# Altium integrated library Altium_WCAP-ATG8 (rev22a).IntLib: 195 symbols (part 1 of 2)
Pins are listed as number, name and electrical type; pins without a type are passive.

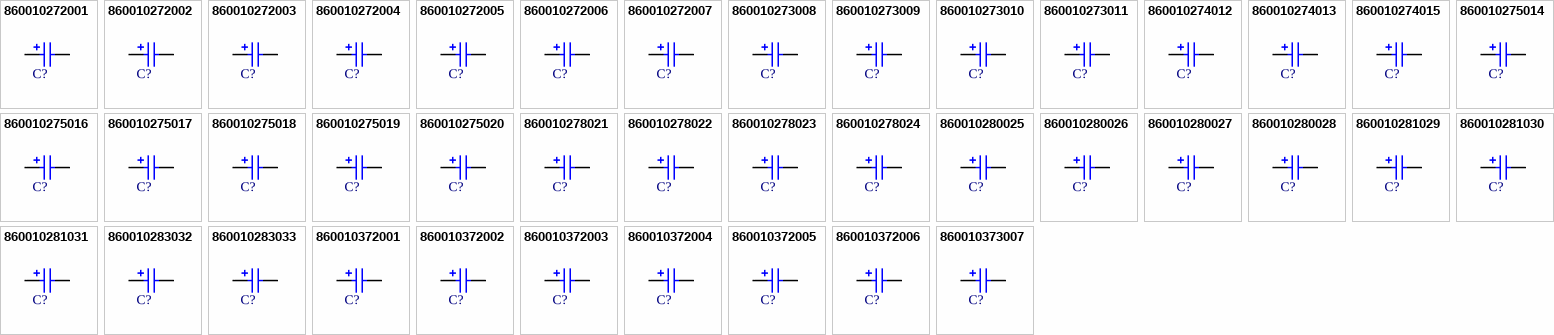
[diagram p0: symbols 860010272001 to 860010373007]

## 860010272001
designator C?, comment 22uF  (value not drawn)
WCAP-ATG8 Aluminum Electrolytic Capacitor, Radial THT, D5xH11mm, 22uF, 10V; Manufacturer: Wurth Elektronik; Manufacturer Part Number: 860010272001; Capacitance Tolerance: +/-20%; Dissipation Factor: 19%; Endurance: 2000h; Leakage Current: 3uA; Ripple Current: 66mA; Technical Reference: ATBC110220M010DSPA3B000; ComponentLink1Description: Manufacturer Link; ComponentLink1URL: https://www.we-online.com/redexpert/article/860010272001?ad; ComponentLink2Description: Datasheet; ComponentLink2URL: https://www.we-online.com/redexpert/spec/860010272001?ad; Category: Aluminum Electrolytic Capacitors; Match Code: WCAP-ATG8; Mount: Through Hole; Operating Temperature Max: 85°C; Operating Temperature Min: -40°C; Packaging: Ammo Pack; Height: 11mm; Diameter: 5mm; Capacitance: 22uF; Rated Voltage (DC): 10V
footprint WCAP-ATG8_D5H11
pins: 1 P, 2 N

## 860010272002
designator C?, comment 33uF  (value not drawn)
WCAP-ATG8 Aluminum Electrolytic Capacitor, Radial THT, D5xH11mm, 33uF, 10V; Manufacturer: Wurth Elektronik; Manufacturer Part Number: 860010272002; Capacitance Tolerance: +/-20%; Dissipation Factor: 19%; Endurance: 2000h; Leakage Current: 3.3uA; Ripple Current: 88mA; Technical Reference: ATBC110330M010DSPA3B000; ComponentLink1Description: Manufacturer Link; ComponentLink1URL: https://www.we-online.com/redexpert/article/860010272002?ad; ComponentLink2Description: Datasheet; ComponentLink2URL: https://www.we-online.com/redexpert/spec/860010272002?ad; Category: Aluminum Electrolytic Capacitors; Match Code: WCAP-ATG8; Mount: Through Hole; Operating Temperature Max: 85°C; Operating Temperature Min: -40°C; Packaging: Ammo Pack; Height: 11mm; Diameter: 5mm; Capacitance: 33uF; Rated Voltage (DC): 10V
footprint WCAP-ATG8_D5H11
pins: 1 P, 2 N

## 860010272003
designator C?, comment 47uF  (value not drawn)
WCAP-ATG8 Aluminum Electrolytic Capacitor, Radial THT, D5xH11mm, 47uF, 10V; Manufacturer: Wurth Elektronik; Manufacturer Part Number: 860010272003; Capacitance Tolerance: +/-20%; Dissipation Factor: 19%; Endurance: 2000h; Leakage Current: 4.7uA; Ripple Current: 105mA; Technical Reference: ATBC110470M010DSPA3B000; ComponentLink1Description: Manufacturer Link; ComponentLink1URL: https://www.we-online.com/redexpert/article/860010272003?ad; ComponentLink2Description: Datasheet; ComponentLink2URL: https://www.we-online.com/redexpert/spec/860010272003?ad; Category: Aluminum Electrolytic Capacitors; Match Code: WCAP-ATG8; Mount: Through Hole; Operating Temperature Max: 85°C; Operating Temperature Min: -40°C; Packaging: Ammo Pack; Height: 11mm; Diameter: 5mm; Capacitance: 47uF; Rated Voltage (DC): 10V
footprint WCAP-ATG8_D5H11
pins: 1 P, 2 N

## 860010272004
designator C?, comment 68uF  (value not drawn)
WCAP-ATG8 Aluminum Electrolytic Capacitor, Radial THT, D5xH11mm, 68uF, 10V; Manufacturer: Wurth Elektronik; Manufacturer Part Number: 860010272004; Capacitance Tolerance: +/-20%; Dissipation Factor: 19%; Endurance: 2000h; Leakage Current: 6.8uA; Ripple Current: 132mA; Technical Reference: ATBC110680M010DSPA3B000; ComponentLink1Description: Manufacturer Link; ComponentLink1URL: https://www.we-online.com/redexpert/article/860010272004?ad; ComponentLink2Description: Datasheet; ComponentLink2URL: https://www.we-online.com/redexpert/spec/860010272004?ad; Category: Aluminum Electrolytic Capacitors; Match Code: WCAP-ATG8; Mount: Through Hole; Operating Temperature Max: 85°C; Operating Temperature Min: -40°C; Packaging: Ammo Pack; Height: 11mm; Diameter: 5mm; Capacitance: 68uF; Rated Voltage (DC): 10V
footprint WCAP-ATG8_D5H11
pins: 1 P, 2 N

## 860010272005
designator C?, comment 100uF  (value not drawn)
WCAP-ATG8 Aluminum Electrolytic Capacitor, Radial THT, D5xH11mm, 100uF, 10V; Manufacturer: Wurth Elektronik; Manufacturer Part Number: 860010272005; Capacitance Tolerance: +/-20%; Dissipation Factor: 19%; Endurance: 2000h; Leakage Current: 10uA; Ripple Current: 198mA; Technical Reference: ATBC110101M010DSPA3B000; ComponentLink1Description: Manufacturer Link; ComponentLink1URL: https://www.we-online.com/redexpert/article/860010272005?ad; ComponentLink2Description: Datasheet; ComponentLink2URL: https://www.we-online.com/redexpert/spec/860010272005?ad; Category: Aluminum Electrolytic Capacitors; Match Code: WCAP-ATG8; Mount: Through Hole; Operating Temperature Max: 85°C; Operating Temperature Min: -40°C; Packaging: Ammo Pack; Height: 11mm; Diameter: 5mm; Capacitance: 100uF; Rated Voltage (DC): 10V
footprint WCAP-ATG8_D5H11
pins: 1 P, 2 N

## 860010272006
designator C?, comment 120uF  (value not drawn)
WCAP-ATG8 Aluminum Electrolytic Capacitor, Radial THT, D5xH11mm, 120uF, 10V; Manufacturer: Wurth Elektronik; Manufacturer Part Number: 860010272006; Capacitance Tolerance: +/-20%; Dissipation Factor: 19%; Endurance: 2000h; Leakage Current: 12uA; Ripple Current: 209mA; Technical Reference: ATBC110121M010DSPA3B000; ComponentLink1Description: Manufacturer Link; ComponentLink1URL: https://www.we-online.com/redexpert/article/860010272006?ad; ComponentLink2Description: Datasheet; ComponentLink2URL: https://www.we-online.com/redexpert/spec/860010272006?ad; Category: Aluminum Electrolytic Capacitors; Match Code: WCAP-ATG8; Mount: Through Hole; Operating Temperature Max: 85°C; Operating Temperature Min: -40°C; Packaging: Ammo Pack; Height: 11mm; Diameter: 5mm; Capacitance: 120uF; Rated Voltage (DC): 10V
footprint WCAP-ATG8_D5H11
pins: 1 P, 2 N

## 860010272007
designator C?, comment 150uF  (value not drawn)
WCAP-ATG8 Aluminum Electrolytic Capacitor, Radial THT, D5xH11mm, 150uF, 10V; Manufacturer: Wurth Elektronik; Manufacturer Part Number: 860010272007; Capacitance Tolerance: +/-20%; Dissipation Factor: 19%; Endurance: 2000h; Leakage Current: 15uA; Ripple Current: 231mA; Technical Reference: ATBC110151M010DSPA3B000; ComponentLink1Description: Manufacturer Link; ComponentLink1URL: https://www.we-online.com/redexpert/article/860010272007?ad; ComponentLink2Description: Datasheet; ComponentLink2URL: https://www.we-online.com/redexpert/spec/860010272007?ad; Category: Aluminum Electrolytic Capacitors; Match Code: WCAP-ATG8; Mount: Through Hole; Operating Temperature Max: 85°C; Operating Temperature Min: -40°C; Packaging: Ammo Pack; Height: 11mm; Diameter: 5mm; Capacitance: 150uF; Rated Voltage (DC): 10V
footprint WCAP-ATG8_D5H11
pins: 1 P, 2 N

## 860010273008
designator C?, comment 180uF  (value not drawn)
WCAP-ATG8 Aluminum Electrolytic Capacitor, Radial THT, D6.3xH11mm, 180uF, 10V; Manufacturer: Wurth Elektronik; Manufacturer Part Number: 860010273008; Capacitance Tolerance: +/-20%; Dissipation Factor: 19%; Endurance: 2000h; Leakage Current: 18uA; Ripple Current: 253mA; Technical Reference: ATBD110181M010DSPA4B000; ComponentLink1Description: Manufacturer Link; ComponentLink1URL: https://www.we-online.com/redexpert/article/860010273008?ad; ComponentLink2Description: Datasheet; ComponentLink2URL: https://www.we-online.com/redexpert/spec/860010273008?ad; Category: Aluminum Electrolytic Capacitors; Match Code: WCAP-ATG8; Mount: Through Hole; Operating Temperature Max: 85°C; Operating Temperature Min: -40°C; Packaging: Ammo Pack; Height: 11mm; Diameter: 6.3mm; Capacitance: 180uF; Rated Voltage (DC): 10V
footprint WCAP-ATG8_D6.3H11
pins: 1 P, 2 N

## 860010273009
designator C?, comment 220uF  (value not drawn)
WCAP-ATG8 Aluminum Electrolytic Capacitor, Radial THT, D6.3xH11mm, 220uF, 10V; Manufacturer: Wurth Elektronik; Manufacturer Part Number: 860010273009; Capacitance Tolerance: +/-20%; Dissipation Factor: 19%; Endurance: 2000h; Leakage Current: 22uA; Ripple Current: 294mA; Technical Reference: ATBD110221M010DSPA4B000; ComponentLink1Description: Manufacturer Link; ComponentLink1URL: https://www.we-online.com/redexpert/article/860010273009?ad; ComponentLink2Description: Datasheet; ComponentLink2URL: https://www.we-online.com/redexpert/spec/860010273009?ad; Category: Aluminum Electrolytic Capacitors; Match Code: WCAP-ATG8; Mount: Through Hole; Operating Temperature Max: 85°C; Operating Temperature Min: -40°C; Packaging: Ammo Pack; Height: 11mm; Diameter: 6.3mm; Capacitance: 220uF; Rated Voltage (DC): 10V
footprint WCAP-ATG8_D6.3H11
pins: 1 P, 2 N

## 860010273010
designator C?, comment 330uF  (value not drawn)
WCAP-ATG8 Aluminum Electrolytic Capacitor, Radial THT, D6.3xH11mm, 330uF, 10V; Manufacturer: Wurth Elektronik; Manufacturer Part Number: 860010273010; Capacitance Tolerance: +/-20%; Dissipation Factor: 19%; Endurance: 2000h; Leakage Current: 33uA; Ripple Current: 363mA; Technical Reference: ATBD110331M010DSPA4B000; ComponentLink1Description: Manufacturer Link; ComponentLink1URL: https://www.we-online.com/redexpert/article/860010273010?ad; ComponentLink2Description: Datasheet; ComponentLink2URL: https://www.we-online.com/redexpert/spec/860010273010?ad; Category: Aluminum Electrolytic Capacitors; Match Code: WCAP-ATG8; Mount: Through Hole; Operating Temperature Max: 85°C; Operating Temperature Min: -40°C; Packaging: Ammo Pack; Height: 11mm; Diameter: 6.3mm; Capacitance: 330uF; Rated Voltage (DC): 10V
footprint WCAP-ATG8_D6.3H11
pins: 1 P, 2 N

## 860010273011
designator C?, comment 470uF  (value not drawn)
WCAP-ATG8 Aluminum Electrolytic Capacitor, Radial THT, D6.3xH11mm, 470uF, 10V; Manufacturer: Wurth Elektronik; Manufacturer Part Number: 860010273011; Capacitance Tolerance: +/-20%; Dissipation Factor: 19%; Endurance: 2000h; Leakage Current: 47uA; Ripple Current: 418mA; Technical Reference: ATBD110471M010DSPA4B000; ComponentLink1Description: Manufacturer Link; ComponentLink1URL: https://www.we-online.com/redexpert/article/860010273011?ad; ComponentLink2Description: Datasheet; ComponentLink2URL: https://www.we-online.com/redexpert/spec/860010273011?ad; Category: Aluminum Electrolytic Capacitors; Match Code: WCAP-ATG8; Mount: Through Hole; Operating Temperature Max: 85°C; Operating Temperature Min: -40°C; Packaging: Ammo Pack; Height: 11mm; Diameter: 6.3mm; Capacitance: 470uF; Rated Voltage (DC): 10V
footprint WCAP-ATG8_D6.3H11
pins: 1 P, 2 N

## 860010274012
designator C?, comment 560uF  (value not drawn)
WCAP-ATG8 Aluminum Electrolytic Capacitor, Radial THT, D8xH11.5mm, 560uF, 10V; Manufacturer: Wurth Elektronik; Manufacturer Part Number: 860010274012; Capacitance Tolerance: +/-20%; Dissipation Factor: 19%; Endurance: 2000h; Leakage Current: 56uA; Ripple Current: 506mA; Technical Reference: ATBE115561M010DSPA7B000; ComponentLink1Description: Manufacturer Link; ComponentLink1URL: https://www.we-online.com/redexpert/article/860010274012?ad; ComponentLink2Description: Datasheet; ComponentLink2URL: https://www.we-online.com/redexpert/spec/860010274012?ad; Category: Aluminum Electrolytic Capacitors; Match Code: WCAP-ATG8; Mount: Through Hole; Operating Temperature Max: 85°C; Operating Temperature Min: -40°C; Packaging: Ammo Pack; Height: 11.5mm; Diameter: 8mm; Capacitance: 560uF; Rated Voltage (DC): 10V
footprint WCAP-ATG8_D8H11.5
pins: 1 P, 2 N

## 860010274013
designator C?, comment 680uF  (value not drawn)
WCAP-ATG8 Aluminum Electrolytic Capacitor, Radial THT, D8xH11.5mm, 680uF, 10V; Manufacturer: Wurth Elektronik; Manufacturer Part Number: 860010274013; Capacitance Tolerance: +/-20%; Dissipation Factor: 19%; Endurance: 2000h; Leakage Current: 68uA; Ripple Current: 572mA; Technical Reference: ATBE115681M010DSPA7B000; ComponentLink1Description: Manufacturer Link; ComponentLink1URL: https://www.we-online.com/redexpert/article/860010274013?ad; ComponentLink2Description: Datasheet; ComponentLink2URL: https://www.we-online.com/redexpert/spec/860010274013?ad; Category: Aluminum Electrolytic Capacitors; Match Code: WCAP-ATG8; Mount: Through Hole; Operating Temperature Max: 85°C; Operating Temperature Min: -40°C; Packaging: Ammo Pack; Height: 11.5mm; Diameter: 8mm; Capacitance: 680uF; Rated Voltage (DC): 10V
footprint WCAP-ATG8_D8H11.5
pins: 1 P, 2 N

## 860010274015
designator C?, comment 1000uF  (value not drawn)
WCAP-ATG8 Aluminum Electrolytic Capacitor, Radial THT, D8xH16mm, 1000uF, 10V; Manufacturer: Wurth Elektronik; Manufacturer Part Number: 860010274015; Capacitance Tolerance: +/-20%; Dissipation Factor: 19%; Endurance: 2000h; Leakage Current: 100uA; Ripple Current: 725mA; Technical Reference: ATBE160102M010DSPA7B000; ComponentLink1Description: Manufacturer Link; ComponentLink1URL: https://www.we-online.com/redexpert/article/860010274015?ad; ComponentLink2Description: Datasheet; ComponentLink2URL: https://www.we-online.com/redexpert/spec/860010274015?ad; Category: Aluminum Electrolytic Capacitors; Match Code: WCAP-ATG8; Mount: Through Hole; Operating Temperature Max: 85°C; Operating Temperature Min: -40°C; Packaging: Ammo Pack; Height: 16mm; Diameter: 8mm; Capacitance: 1000uF; Rated Voltage (DC): 10V
footprint WCAP-ATG8_D8H16
pins: 1 P, 2 N

## 860010275014
designator C?, comment 820uF  (value not drawn)
WCAP-ATG8 Aluminum Electrolytic Capacitor, Radial THT, D10xH12.5mm, 820uF, 10V; Manufacturer: Wurth Elektronik; Manufacturer Part Number: 860010275014; Capacitance Tolerance: +/-20%; Dissipation Factor: 19%; Endurance: 2000h; Leakage Current: 82uA; Ripple Current: 671mA; Technical Reference: ATBF125821M010DSPA9B000; ComponentLink1Description: Manufacturer Link; ComponentLink1URL: https://www.we-online.com/redexpert/article/860010275014?ad; ComponentLink2Description: Datasheet; ComponentLink2URL: https://www.we-online.com/redexpert/spec/860010275014?ad; Category: Aluminum Electrolytic Capacitors; Match Code: WCAP-ATG8; Mount: Through Hole; Operating Temperature Max: 85°C; Operating Temperature Min: -40°C; Packaging: Ammo Pack; Height: 12.5mm; Diameter: 10mm; Capacitance: 820uF; Rated Voltage (DC): 10V
footprint WCAP-ATG8_D10H12.5
pins: 1 P, 2 N

## 860010275016
designator C?, comment 1000uF  (value not drawn)
WCAP-ATG8 Aluminum Electrolytic Capacitor, Radial THT, D10xH12.5mm, 1000uF, 10V; Manufacturer: Wurth Elektronik; Manufacturer Part Number: 860010275016; Capacitance Tolerance: +/-20%; Dissipation Factor: 19%; Endurance: 2000h; Leakage Current: 100uA; Ripple Current: 726mA; Technical Reference: ATBF125102M010DSPA9B000; ComponentLink1Description: Manufacturer Link; ComponentLink1URL: https://www.we-online.com/redexpert/article/860010275016?ad; ComponentLink2Description: Datasheet; ComponentLink2URL: https://www.we-online.com/redexpert/spec/860010275016?ad; Category: Aluminum Electrolytic Capacitors; Match Code: WCAP-ATG8; Mount: Through Hole; Operating Temperature Max: 85°C; Operating Temperature Min: -40°C; Packaging: Ammo Pack; Height: 12.5mm; Diameter: 10mm; Capacitance: 1000uF; Rated Voltage (DC): 10V
footprint WCAP-ATG8_D10H12.5
pins: 1 P, 2 N

## 860010275017
designator C?, comment 1200uF  (value not drawn)
WCAP-ATG8 Aluminum Electrolytic Capacitor, Radial THT, D10xH16mm, 1200uF, 10V; Manufacturer: Wurth Elektronik; Manufacturer Part Number: 860010275017; Capacitance Tolerance: +/-20%; Dissipation Factor: 19%; Endurance: 2000h; Leakage Current: 120uA; Ripple Current: 902mA; Technical Reference: ATBF160122M010DSPAAB000; ComponentLink1Description: Manufacturer Link; ComponentLink1URL: https://www.we-online.com/redexpert/article/860010275017?ad; ComponentLink2Description: Datasheet; ComponentLink2URL: https://www.we-online.com/redexpert/spec/860010275017?ad; Category: Aluminum Electrolytic Capacitors; Match Code: WCAP-ATG8; Mount: Through Hole; Operating Temperature Max: 85°C; Operating Temperature Min: -40°C; Packaging: Ammo Pack; Height: 16mm; Diameter: 10mm; Capacitance: 1200uF; Rated Voltage (DC): 10V
footprint WCAP-ATG8_D10H16
pins: 1 P, 2 N

## 860010275018
designator C?, comment 1500uF  (value not drawn)
WCAP-ATG8 Aluminum Electrolytic Capacitor, Radial THT, D10xH16mm, 1500uF, 10V; Manufacturer: Wurth Elektronik; Manufacturer Part Number: 860010275018; Capacitance Tolerance: +/-20%; Dissipation Factor: 19%; Endurance: 2000h; Leakage Current: 150uA; Ripple Current: 1001mA; Technical Reference: ATBF160152M010DSPAAB000; ComponentLink1Description: Manufacturer Link; ComponentLink1URL: https://www.we-online.com/redexpert/article/860010275018?ad; ComponentLink2Description: Datasheet; ComponentLink2URL: https://www.we-online.com/redexpert/spec/860010275018?ad; Category: Aluminum Electrolytic Capacitors; Match Code: WCAP-ATG8; Mount: Through Hole; Operating Temperature Max: 85°C; Operating Temperature Min: -40°C; Packaging: Ammo Pack; Height: 16mm; Diameter: 10mm; Capacitance: 1500uF; Rated Voltage (DC): 10V
footprint WCAP-ATG8_D10H16
pins: 1 P, 2 N

## 860010275019
designator C?, comment 1800uF  (value not drawn)
WCAP-ATG8 Aluminum Electrolytic Capacitor, Radial THT, D10xH20mm, 1800uF, 10V; Manufacturer: Wurth Elektronik; Manufacturer Part Number: 860010275019; Capacitance Tolerance: +/-20%; Dissipation Factor: 19%; Endurance: 2000h; Leakage Current: 180uA; Ripple Current: 1089mA; Technical Reference: ATBF200182M010DSPAAB000; ComponentLink1Description: Manufacturer Link; ComponentLink1URL: https://www.we-online.com/redexpert/article/860010275019?ad; ComponentLink2Description: Datasheet; ComponentLink2URL: https://www.we-online.com/redexpert/spec/860010275019?ad; Category: Aluminum Electrolytic Capacitors; Match Code: WCAP-ATG8; Mount: Through Hole; Operating Temperature Max: 85°C; Operating Temperature Min: -40°C; Packaging: Ammo Pack; Height: 20mm; Diameter: 10mm; Capacitance: 1800uF; Rated Voltage (DC): 10V
footprint WCAP-ATG8_D10H20
pins: 1 P, 2 N

## 860010275020
designator C?, comment 2200uF  (value not drawn)
WCAP-ATG8 Aluminum Electrolytic Capacitor, Radial THT, D10xH20mm, 2200uF, 10V; Manufacturer: Wurth Elektronik; Manufacturer Part Number: 860010275020; Capacitance Tolerance: +/-20%; Dissipation Factor: 19%; Endurance: 2000h; Leakage Current: 220uA; Ripple Current: 1210mA; Technical Reference: ATBF200222M010DSPAAB000; ComponentLink1Description: Manufacturer Link; ComponentLink1URL: https://www.we-online.com/redexpert/article/860010275020?ad; ComponentLink2Description: Datasheet; ComponentLink2URL: https://www.we-online.com/redexpert/spec/860010275020?ad; Category: Aluminum Electrolytic Capacitors; Match Code: WCAP-ATG8; Mount: Through Hole; Operating Temperature Max: 85°C; Operating Temperature Min: -40°C; Packaging: Ammo Pack; Height: 20mm; Diameter: 10mm; Capacitance: 2200uF; Rated Voltage (DC): 10V
footprint WCAP-ATG8_D10H20
pins: 1 P, 2 N

## 860010278021
designator C?, comment 2700uF  (value not drawn)
WCAP-ATG8 Aluminum Electrolytic Capacitor, Radial THT, D13xH20mm, 2700uF, 10V; Manufacturer: Wurth Elektronik; Manufacturer Part Number: 860010278021; Capacitance Tolerance: +/-20%; Dissipation Factor: 19%; Endurance: 2000h; Leakage Current: 270uA; Ripple Current: 1419mA; Technical Reference: ATBI200272M010DSPACB000; ComponentLink1Description: Manufacturer Link; ComponentLink1URL: https://www.we-online.com/redexpert/article/860010278021?ad; ComponentLink2Description: Datasheet; ComponentLink2URL: https://www.we-online.com/redexpert/spec/860010278021?ad; Category: Aluminum Electrolytic Capacitors; Match Code: WCAP-ATG8; Mount: Through Hole; Operating Temperature Max: 85°C; Operating Temperature Min: -40°C; Packaging: Ammo Pack; Height: 20mm; Diameter: 13mm; Capacitance: 2700uF; Rated Voltage (DC): 10V
footprint WCAP-ATG8_D13H20
pins: 1 P, 2 N

## 860010278022
designator C?, comment 3300uF  (value not drawn)
WCAP-ATG8 Aluminum Electrolytic Capacitor, Radial THT, D13xH20mm, 3300uF, 10V; Manufacturer: Wurth Elektronik; Manufacturer Part Number: 860010278022; Capacitance Tolerance: +/-20%; Dissipation Factor: 19%; Endurance: 2000h; Leakage Current: 330uA; Ripple Current: 1540mA; Technical Reference: ATBI200332M010DSPACB000; ComponentLink1Description: Manufacturer Link; ComponentLink1URL: https://www.we-online.com/redexpert/article/860010278022?ad; ComponentLink2Description: Datasheet; ComponentLink2URL: https://www.we-online.com/redexpert/spec/860010278022?ad; Category: Aluminum Electrolytic Capacitors; Match Code: WCAP-ATG8; Mount: Through Hole; Operating Temperature Max: 85°C; Operating Temperature Min: -40°C; Packaging: Ammo Pack; Height: 20mm; Diameter: 13mm; Capacitance: 3300uF; Rated Voltage (DC): 10V
footprint WCAP-ATG8_D13H20
pins: 1 P, 2 N

## 860010278023
designator C?, comment 3900uF  (value not drawn)
WCAP-ATG8 Aluminum Electrolytic Capacitor, Radial THT, D13xH20mm, 3900uF, 10V; Manufacturer: Wurth Elektronik; Manufacturer Part Number: 860010278023; Capacitance Tolerance: +/-20%; Dissipation Factor: 19%; Endurance: 2000h; Leakage Current: 390uA; Ripple Current: 1760mA; Technical Reference: ATBI200392M010DSPACB000; ComponentLink1Description: Manufacturer Link; ComponentLink1URL: https://www.we-online.com/redexpert/article/860010278023?ad; ComponentLink2Description: Datasheet; ComponentLink2URL: https://www.we-online.com/redexpert/spec/860010278023?ad; Category: Aluminum Electrolytic Capacitors; Match Code: WCAP-ATG8; Mount: Through Hole; Operating Temperature Max: 85°C; Operating Temperature Min: -40°C; Packaging: Ammo Pack; Height: 20mm; Diameter: 13mm; Capacitance: 3900uF; Rated Voltage (DC): 10V
footprint WCAP-ATG8_D13H20
pins: 1 P, 2 N

## 860010278024
designator C?, comment 4700uF  (value not drawn)
WCAP-ATG8 Aluminum Electrolytic Capacitor, Radial THT, D13xH25mm, 4700uF, 10V; Manufacturer: Wurth Elektronik; Manufacturer Part Number: 860010278024; Capacitance Tolerance: +/-20%; Dissipation Factor: 19%; Endurance: 2000h; Leakage Current: 470uA; Ripple Current: 1980mA; Technical Reference: ATBI250472M010DSPACB000; ComponentLink1Description: Manufacturer Link; ComponentLink1URL: https://www.we-online.com/redexpert/article/860010278024?ad; ComponentLink2Description: Datasheet; ComponentLink2URL: https://www.we-online.com/redexpert/spec/860010278024?ad; Category: Aluminum Electrolytic Capacitors; Match Code: WCAP-ATG8; Mount: Through Hole; Operating Temperature Max: 85°C; Operating Temperature Min: -40°C; Packaging: Ammo Pack; Height: 25mm; Diameter: 13mm; Capacitance: 4700uF; Rated Voltage (DC): 10V
footprint WCAP-ATG8_D13H25
pins: 1 P, 2 N

## 860010280025
designator C?, comment 5600uF  (value not drawn)
WCAP-ATG8 Aluminum Electrolytic Capacitor, Radial THT, D16xH25mm, 5600uF, 10V; Manufacturer: Wurth Elektronik; Manufacturer Part Number: 860010280025; Capacitance Tolerance: +/-20%; Dissipation Factor: 19%; Endurance: 2000h; Leakage Current: 560uA; Ripple Current: 2189mA; Technical Reference: ATBK250562M010DSPAEB000; ComponentLink1Description: Manufacturer Link; ComponentLink1URL: https://www.we-online.com/redexpert/article/860010280025?ad; ComponentLink2Description: Datasheet; ComponentLink2URL: https://www.we-online.com/redexpert/spec/860010280025?ad; Category: Aluminum Electrolytic Capacitors; Match Code: WCAP-ATG8; Mount: Through Hole; Operating Temperature Max: 85°C; Operating Temperature Min: -40°C; Packaging: Ammo Pack; Height: 25mm; Diameter: 16mm; Capacitance: 5600uF; Rated Voltage (DC): 10V
footprint WCAP-ATG8_D16H25
pins: 1 P, 2 N

## 860010280026
designator C?, comment 6800uF  (value not drawn)
WCAP-ATG8 Aluminum Electrolytic Capacitor, Radial THT, D16xH25mm, 6800uF, 10V; Manufacturer: Wurth Elektronik; Manufacturer Part Number: 860010280026; Capacitance Tolerance: +/-20%; Dissipation Factor: 19%; Endurance: 2000h; Leakage Current: 680uA; Ripple Current: 2475mA; Technical Reference: ATBK250682M010DSPAEB000; ComponentLink1Description: Manufacturer Link; ComponentLink1URL: https://www.we-online.com/redexpert/article/860010280026?ad; ComponentLink2Description: Datasheet; ComponentLink2URL: https://www.we-online.com/redexpert/spec/860010280026?ad; Category: Aluminum Electrolytic Capacitors; Match Code: WCAP-ATG8; Mount: Through Hole; Operating Temperature Max: 85°C; Operating Temperature Min: -40°C; Packaging: Ammo Pack; Height: 25mm; Diameter: 16mm; Capacitance: 6800uF; Rated Voltage (DC): 10V
footprint WCAP-ATG8_D16H25
pins: 1 P, 2 N

## 860010280027
designator C?, comment 8200uF  (value not drawn)
WCAP-ATG8 Aluminum Electrolytic Capacitor, Radial THT, D16xH31.5mm, 8200uF, 10V; Manufacturer: Wurth Elektronik; Manufacturer Part Number: 860010280027; Capacitance Tolerance: +/-20%; Dissipation Factor: 19%; Endurance: 2000h; Leakage Current: 820uA; Ripple Current: 2541mA; Technical Reference: ATBK315822M010DSPADB000; ComponentLink1Description: Manufacturer Link; ComponentLink1URL: https://www.we-online.com/redexpert/article/860010280027?ad; ComponentLink2Description: Datasheet; ComponentLink2URL: https://www.we-online.com/redexpert/spec/860010280027?ad; Category: Aluminum Electrolytic Capacitors; Match Code: WCAP-ATG8; Mount: Through Hole; Operating Temperature Max: 85°C; Operating Temperature Min: -40°C; Packaging: Ammo Pack; Height: 31.5mm; Diameter: 16mm; Capacitance: 8200uF; Rated Voltage (DC): 10V
footprint WCAP-ATG8_D16H31.5
pins: 1 P, 2 N

## 860010280028
designator C?, comment 10000uF  (value not drawn)
WCAP-ATG8 Aluminum Electrolytic Capacitor, Radial THT, D16xH35.5mm, 10000uF, 10V; Manufacturer: Wurth Elektronik; Manufacturer Part Number: 860010280028; Capacitance Tolerance: +/-20%; Dissipation Factor: 19%; Endurance: 2000h; Leakage Current: 1000uA; Ripple Current: 2640mA; Technical Reference: ATBK355103M010DSPADB000; ComponentLink1Description: Manufacturer Link; ComponentLink1URL: https://www.we-online.com/redexpert/article/860010280028?ad; ComponentLink2Description: Datasheet; ComponentLink2URL: https://www.we-online.com/redexpert/spec/860010280028?ad; Category: Aluminum Electrolytic Capacitors; Match Code: WCAP-ATG8; Mount: Through Hole; Operating Temperature Max: 85°C; Operating Temperature Min: -40°C; Packaging: Ammo Pack; Height: 35.5mm; Diameter: 16mm; Capacitance: 10000uF; Rated Voltage (DC): 10V
footprint WCAP-ATG8_D16H35.5
pins: 1 P, 2 N

## 860010281029
designator C?, comment 12000uF  (value not drawn)
WCAP-ATG8 Aluminum Electrolytic Capacitor, Radial THT, D18xH35.5mm, 12000uF, 10V; Manufacturer: Wurth Elektronik; Manufacturer Part Number: 860010281029; Capacitance Tolerance: +/-20%; Dissipation Factor: 19%; Endurance: 2000h; Leakage Current: 1200uA; Ripple Current: 3025mA; Technical Reference: ATBL355123M010DSPAEB000; ComponentLink1Description: Manufacturer Link; ComponentLink1URL: https://www.we-online.com/redexpert/article/860010281029?ad; ComponentLink2Description: Datasheet; ComponentLink2URL: https://www.we-online.com/redexpert/spec/860010281029?ad; Category: Aluminum Electrolytic Capacitors; Match Code: WCAP-ATG8; Mount: Through Hole; Operating Temperature Max: 85°C; Operating Temperature Min: -40°C; Packaging: Ammo Pack; Height: 35.5mm; Diameter: 18mm; Capacitance: 12000uF; Rated Voltage (DC): 10V
footprint WCAP-ATG8_D18H35.5
pins: 1 P, 2 N

## 860010281030
designator C?, comment 15000uF  (value not drawn)
WCAP-ATG8 Aluminum Electrolytic Capacitor, Radial THT, D18xH35.5mm, 15000uF, 10V; Manufacturer: Wurth Elektronik; Manufacturer Part Number: 860010281030; Capacitance Tolerance: +/-20%; Dissipation Factor: 19%; Endurance: 2000h; Leakage Current: 1500uA; Ripple Current: 3310mA; Technical Reference: ATBL355153M010DSPAEB000; ComponentLink1Description: Manufacturer Link; ComponentLink1URL: https://www.we-online.com/redexpert/article/860010281030?ad; ComponentLink2Description: Datasheet; ComponentLink2URL: https://www.we-online.com/redexpert/spec/860010281030?ad; Category: Aluminum Electrolytic Capacitors; Match Code: WCAP-ATG8; Mount: Through Hole; Operating Temperature Max: 85°C; Operating Temperature Min: -40°C; Packaging: Ammo Pack; Height: 35.5mm; Diameter: 18mm; Capacitance: 15000uF; Rated Voltage (DC): 10V
footprint WCAP-ATG8_D18H35.5
pins: 1 P, 2 N

## 860010281031
designator C?, comment 18000uF  (value not drawn)
WCAP-ATG8 Aluminum Electrolytic Capacitor, Radial THT, D18xH41mm, 18000uF, 10V; Manufacturer: Wurth Elektronik; Manufacturer Part Number: 860010281031; Capacitance Tolerance: +/-20%; Dissipation Factor: 19%; Endurance: 2000h; Leakage Current: 1800uA; Ripple Current: 3410mA; Technical Reference: ATBL410183M010DSPS1B000; ComponentLink1Description: Manufacturer Link; ComponentLink1URL: https://www.we-online.com/redexpert/article/860010281031?ad; ComponentLink2Description: Datasheet; ComponentLink2URL: https://www.we-online.com/redexpert/spec/860010281031?ad; Category: Aluminum Electrolytic Capacitors; Match Code: WCAP-ATG8; Mount: Through Hole; Operating Temperature Max: 85°C; Operating Temperature Min: -40°C; Packaging: Ammo Pack; Height: 41mm; Diameter: 18mm; Capacitance: 18000uF; Rated Voltage (DC): 10V
footprint WCAP-ATG8_D18H41
pins: 1 P, 2 N

## 860010283032
designator C?, comment 22000uF  (value not drawn)
WCAP-ATG8 Aluminum Electrolytic Capacitor, Radial THT, D22xH41mm, 22000uF, 10V; Manufacturer: Wurth Elektronik; Manufacturer Part Number: 860010283032; Capacitance Tolerance: +/-20%; Dissipation Factor: 19%; Endurance: 2000h; Leakage Current: 2200uA; Ripple Current: 4092mA; Technical Reference: ATBN410223M010DSPS2B000; ComponentLink1Description: Manufacturer Link; ComponentLink1URL: https://www.we-online.com/redexpert/article/860010283032?ad; ComponentLink2Description: Datasheet; ComponentLink2URL: https://www.we-online.com/redexpert/spec/860010283032?ad; Category: Aluminum Electrolytic Capacitors; Match Code: WCAP-ATG8; Mount: Through Hole; Operating Temperature Max: 85°C; Operating Temperature Min: -40°C; Packaging: Ammo Pack; Height: 41mm; Diameter: 22mm; Capacitance: 22000uF; Rated Voltage (DC): 10V
footprint WCAP-ATG8_D22H41
pins: 1 P, 2 N

## 860010283033
designator C?, comment 33000uF  (value not drawn)
WCAP-ATG8 Aluminum Electrolytic Capacitor, Radial THT, D22xH51mm, 33000uF, 10V; Manufacturer: Wurth Elektronik; Manufacturer Part Number: 860010283033; Capacitance Tolerance: +/-20%; Dissipation Factor: 19%; Endurance: 2000h; Leakage Current: 3300uA; Ripple Current: 4620mA; Technical Reference: ATBN510333M010DSPS2B000; ComponentLink1Description: Manufacturer Link; ComponentLink1URL: https://www.we-online.com/redexpert/article/860010283033?ad; ComponentLink2Description: Datasheet; ComponentLink2URL: https://www.we-online.com/redexpert/spec/860010283033?ad; Category: Aluminum Electrolytic Capacitors; Match Code: WCAP-ATG8; Mount: Through Hole; Operating Temperature Max: 85°C; Operating Temperature Min: -40°C; Packaging: Ammo Pack; Height: 51mm; Diameter: 22mm; Capacitance: 33000uF; Rated Voltage (DC): 10V
footprint WCAP-ATG8_D22H51
pins: 1 P, 2 N

## 860010372001
designator C?, comment 10uF  (value not drawn)
WCAP-ATG8 Aluminum Electrolytic Capacitor, Radial THT, D5xH11mm, 10uF, 16V; Manufacturer: Wurth Elektronik; Manufacturer Part Number: 860010372001; Capacitance Tolerance: +/-20%; Dissipation Factor: 16%; Endurance: 2000h; Leakage Current: 3uA; Ripple Current: 44mA; Technical Reference: ATBC110100M016DSPA3B000; ComponentLink1Description: Manufacturer Link; ComponentLink1URL: https://www.we-online.com/redexpert/article/860010372001?ad; ComponentLink2Description: Datasheet; ComponentLink2URL: https://www.we-online.com/redexpert/spec/860010372001?ad; Category: Aluminum Electrolytic Capacitors; Match Code: WCAP-ATG8; Mount: Through Hole; Operating Temperature Max: 85°C; Operating Temperature Min: -40°C; Packaging: Ammo Pack; Height: 11mm; Diameter: 5mm; Capacitance: 10uF; Rated Voltage (DC): 16V
footprint WCAP-ATG8_D5H11
pins: 1 P, 2 N

## 860010372002
designator C?, comment 22uF  (value not drawn)
WCAP-ATG8 Aluminum Electrolytic Capacitor, Radial THT, D5xH11mm, 22uF, 16V; Manufacturer: Wurth Elektronik; Manufacturer Part Number: 860010372002; Capacitance Tolerance: +/-20%; Dissipation Factor: 16%; Endurance: 2000h; Leakage Current: 3.52uA; Ripple Current: 83mA; Technical Reference: ATBC110220M016DSPA3B000; ComponentLink1Description: Manufacturer Link; ComponentLink1URL: https://www.we-online.com/redexpert/article/860010372002?ad; ComponentLink2Description: Datasheet; ComponentLink2URL: https://www.we-online.com/redexpert/spec/860010372002?ad; Category: Aluminum Electrolytic Capacitors; Match Code: WCAP-ATG8; Mount: Through Hole; Operating Temperature Max: 85°C; Operating Temperature Min: -40°C; Packaging: Ammo Pack; Height: 11mm; Diameter: 5mm; Capacitance: 22uF; Rated Voltage (DC): 16V
footprint WCAP-ATG8_D5H11
pins: 1 P, 2 N

## 860010372003
designator C?, comment 33uF  (value not drawn)
WCAP-ATG8 Aluminum Electrolytic Capacitor, Radial THT, D5xH11mm, 33uF, 16V; Manufacturer: Wurth Elektronik; Manufacturer Part Number: 860010372003; Capacitance Tolerance: +/-20%; Dissipation Factor: 16%; Endurance: 2000h; Leakage Current: 5.28uA; Ripple Current: 84mA; Technical Reference: ATBC110330M016DSPA3B000; ComponentLink1Description: Manufacturer Link; ComponentLink1URL: https://www.we-online.com/redexpert/article/860010372003?ad; ComponentLink2Description: Datasheet; ComponentLink2URL: https://www.we-online.com/redexpert/spec/860010372003?ad; Category: Aluminum Electrolytic Capacitors; Match Code: WCAP-ATG8; Mount: Through Hole; Operating Temperature Max: 85°C; Operating Temperature Min: -40°C; Packaging: Ammo Pack; Height: 11mm; Diameter: 5mm; Capacitance: 33uF; Rated Voltage (DC): 16V
footprint WCAP-ATG8_D5H11
pins: 1 P, 2 N

## 860010372004
designator C?, comment 47uF  (value not drawn)
WCAP-ATG8 Aluminum Electrolytic Capacitor, Radial THT, D5xH11mm, 47uF, 16V; Manufacturer: Wurth Elektronik; Manufacturer Part Number: 860010372004; Capacitance Tolerance: +/-20%; Dissipation Factor: 16%; Endurance: 2000h; Leakage Current: 7.52uA; Ripple Current: 132mA; Technical Reference: ATBC110470M016DSPA3B000; ComponentLink1Description: Manufacturer Link; ComponentLink1URL: https://www.we-online.com/redexpert/article/860010372004?ad; ComponentLink2Description: Datasheet; ComponentLink2URL: https://www.we-online.com/redexpert/spec/860010372004?ad; Category: Aluminum Electrolytic Capacitors; Match Code: WCAP-ATG8; Mount: Through Hole; Operating Temperature Max: 85°C; Operating Temperature Min: -40°C; Packaging: Ammo Pack; Height: 11mm; Diameter: 5mm; Capacitance: 47uF; Rated Voltage (DC): 16V
footprint WCAP-ATG8_D5H11
pins: 1 P, 2 N

## 860010372005
designator C?, comment 68uF  (value not drawn)
WCAP-ATG8 Aluminum Electrolytic Capacitor, Radial THT, D5xH11mm, 68uF, 16V; Manufacturer: Wurth Elektronik; Manufacturer Part Number: 860010372005; Capacitance Tolerance: +/-20%; Dissipation Factor: 16%; Endurance: 2000h; Leakage Current: 10.88uA; Ripple Current: 149mA; Technical Reference: ATBC110680M016DSPA3B000; ComponentLink1Description: Manufacturer Link; ComponentLink1URL: https://www.we-online.com/redexpert/article/860010372005?ad; ComponentLink2Description: Datasheet; ComponentLink2URL: https://www.we-online.com/redexpert/spec/860010372005?ad; Category: Aluminum Electrolytic Capacitors; Match Code: WCAP-ATG8; Mount: Through Hole; Operating Temperature Max: 85°C; Operating Temperature Min: -40°C; Packaging: Ammo Pack; Height: 11mm; Diameter: 5mm; Capacitance: 68uF; Rated Voltage (DC): 16V
footprint WCAP-ATG8_D5H11
pins: 1 P, 2 N

## 860010372006
designator C?, comment 100uF  (value not drawn)
WCAP-ATG8 Aluminum Electrolytic Capacitor, Radial THT, D5xH11mm, 100uF, 16V; Manufacturer: Wurth Elektronik; Manufacturer Part Number: 860010372006; Capacitance Tolerance: +/-20%; Dissipation Factor: 16%; Endurance: 2000h; Leakage Current: 16uA; Ripple Current: 176mA; Technical Reference: ATBC110101M016DSPA3B000; ComponentLink1Description: Manufacturer Link; ComponentLink1URL: https://www.we-online.com/redexpert/article/860010372006?ad; ComponentLink2Description: Datasheet; ComponentLink2URL: https://www.we-online.com/redexpert/spec/860010372006?ad; Category: Aluminum Electrolytic Capacitors; Match Code: WCAP-ATG8; Mount: Through Hole; Operating Temperature Max: 85°C; Operating Temperature Min: -40°C; Packaging: Ammo Pack; Height: 11mm; Diameter: 5mm; Capacitance: 100uF; Rated Voltage (DC): 16V
footprint WCAP-ATG8_D5H11
pins: 1 P, 2 N

## 860010373007
designator C?, comment 120uF  (value not drawn)
WCAP-ATG8 Aluminum Electrolytic Capacitor, Radial THT, D6.3xH11mm, 120uF, 16V; Manufacturer: Wurth Elektronik; Manufacturer Part Number: 860010373007; Capacitance Tolerance: +/-20%; Dissipation Factor: 16%; Endurance: 2000h; Leakage Current: 19.2uA; Ripple Current: 231mA; Technical Reference: ATBD110121M016DSPA4B000; ComponentLink1Description: Manufacturer Link; ComponentLink1URL: https://www.we-online.com/redexpert/article/860010373007?ad; ComponentLink2Description: Datasheet; ComponentLink2URL: https://www.we-online.com/redexpert/spec/860010373007?ad; Category: Aluminum Electrolytic Capacitors; Match Code: WCAP-ATG8; Mount: Through Hole; Operating Temperature Max: 85°C; Operating Temperature Min: -40°C; Packaging: Ammo Pack; Height: 11mm; Diameter: 6.3mm; Capacitance: 120uF; Rated Voltage (DC): 16V
footprint WCAP-ATG8_D6.3H11
pins: 1 P, 2 N

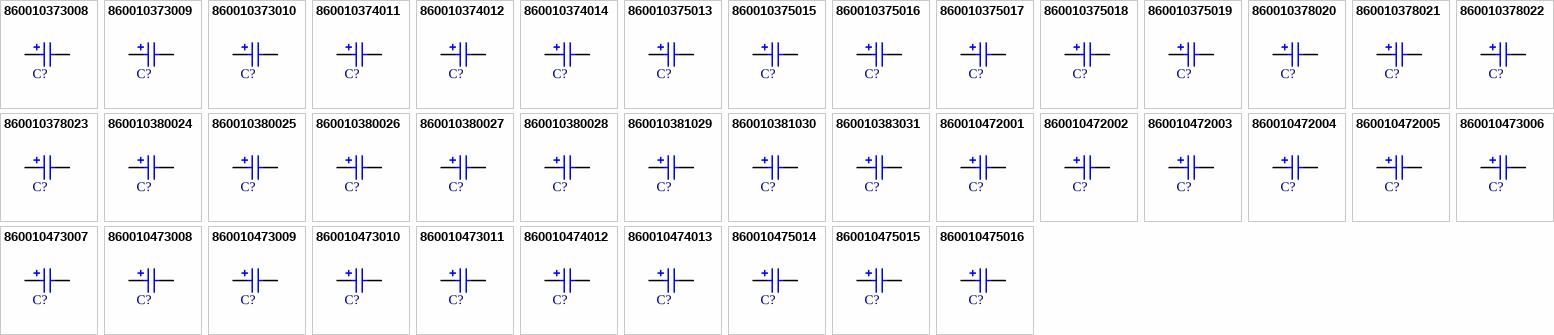
[diagram p1: symbols 860010373008 to 860010475016]

## 860010373008
designator C?, comment 150uF  (value not drawn)
WCAP-ATG8 Aluminum Electrolytic Capacitor, Radial THT, D6.3xH11mm, 150uF, 16V; Manufacturer: Wurth Elektronik; Manufacturer Part Number: 860010373008; Capacitance Tolerance: +/-20%; Dissipation Factor: 16%; Endurance: 2000h; Leakage Current: 24uA; Ripple Current: 253mA; Technical Reference: ATBD110151M016DSPA4B000; ComponentLink1Description: Manufacturer Link; ComponentLink1URL: https://www.we-online.com/redexpert/article/860010373008?ad; ComponentLink2Description: Datasheet; ComponentLink2URL: https://www.we-online.com/redexpert/spec/860010373008?ad; Category: Aluminum Electrolytic Capacitors; Match Code: WCAP-ATG8; Mount: Through Hole; Operating Temperature Max: 85°C; Operating Temperature Min: -40°C; Packaging: Ammo Pack; Height: 11mm; Diameter: 6.3mm; Capacitance: 150uF; Rated Voltage (DC): 16V
footprint WCAP-ATG8_D6.3H11
pins: 1 P, 2 N

## 860010373009
designator C?, comment 180uF  (value not drawn)
WCAP-ATG8 Aluminum Electrolytic Capacitor, Radial THT, D6.3xH11mm, 180uF, 16V; Manufacturer: Wurth Elektronik; Manufacturer Part Number: 860010373009; Capacitance Tolerance: +/-20%; Dissipation Factor: 16%; Endurance: 2000h; Leakage Current: 28.8uA; Ripple Current: 275mA; Technical Reference: ATBD110181M016DSPA4B000; ComponentLink1Description: Manufacturer Link; ComponentLink1URL: https://www.we-online.com/redexpert/article/860010373009?ad; ComponentLink2Description: Datasheet; ComponentLink2URL: https://www.we-online.com/redexpert/spec/860010373009?ad; Category: Aluminum Electrolytic Capacitors; Match Code: WCAP-ATG8; Mount: Through Hole; Operating Temperature Max: 85°C; Operating Temperature Min: -40°C; Packaging: Ammo Pack; Height: 11mm; Diameter: 6.3mm; Capacitance: 180uF; Rated Voltage (DC): 16V
footprint WCAP-ATG8_D6.3H11
pins: 1 P, 2 N

## 860010373010
designator C?, comment 220uF  (value not drawn)
WCAP-ATG8 Aluminum Electrolytic Capacitor, Radial THT, D6.3xH11mm, 220uF, 16V; Manufacturer: Wurth Elektronik; Manufacturer Part Number: 860010373010; Capacitance Tolerance: +/-20%; Dissipation Factor: 16%; Endurance: 2000h; Leakage Current: 35.2uA; Ripple Current: 308mA; Technical Reference: ATBD110221M016DSPA4B000; ComponentLink1Description: Manufacturer Link; ComponentLink1URL: https://www.we-online.com/redexpert/article/860010373010?ad; ComponentLink2Description: Datasheet; ComponentLink2URL: https://www.we-online.com/redexpert/spec/860010373010?ad; Category: Aluminum Electrolytic Capacitors; Match Code: WCAP-ATG8; Mount: Through Hole; Operating Temperature Max: 85°C; Operating Temperature Min: -40°C; Packaging: Ammo Pack; Height: 11mm; Diameter: 6.3mm; Capacitance: 220uF; Rated Voltage (DC): 16V
footprint WCAP-ATG8_D6.3H11
pins: 1 P, 2 N

## 860010374011
designator C?, comment 330uF  (value not drawn)
WCAP-ATG8 Aluminum Electrolytic Capacitor, Radial THT, D8xH11.5mm, 330uF, 16V; Manufacturer: Wurth Elektronik; Manufacturer Part Number: 860010374011; Capacitance Tolerance: +/-20%; Dissipation Factor: 16%; Endurance: 2000h; Leakage Current: 52.8uA; Ripple Current: 407mA; Technical Reference: ATBE115331M016DSPA7B000; ComponentLink1Description: Manufacturer Link; ComponentLink1URL: https://www.we-online.com/redexpert/article/860010374011?ad; ComponentLink2Description: Datasheet; ComponentLink2URL: https://www.we-online.com/redexpert/spec/860010374011?ad; Category: Aluminum Electrolytic Capacitors; Match Code: WCAP-ATG8; Mount: Through Hole; Operating Temperature Max: 85°C; Operating Temperature Min: -40°C; Packaging: Ammo Pack; Height: 11.5mm; Diameter: 8mm; Capacitance: 330uF; Rated Voltage (DC): 16V
footprint WCAP-ATG8_D8H11.5
pins: 1 P, 2 N

## 860010374012
designator C?, comment 470uF  (value not drawn)
WCAP-ATG8 Aluminum Electrolytic Capacitor, Radial THT, D8xH11.5mm, 470uF, 16V; Manufacturer: Wurth Elektronik; Manufacturer Part Number: 860010374012; Capacitance Tolerance: +/-20%; Dissipation Factor: 16%; Endurance: 2000h; Leakage Current: 75.2uA; Ripple Current: 517mA; Technical Reference: ATBE115471M016DSPA7B000; ComponentLink1Description: Manufacturer Link; ComponentLink1URL: https://www.we-online.com/redexpert/article/860010374012?ad; ComponentLink2Description: Datasheet; ComponentLink2URL: https://www.we-online.com/redexpert/spec/860010374012?ad; Category: Aluminum Electrolytic Capacitors; Match Code: WCAP-ATG8; Mount: Through Hole; Operating Temperature Max: 85°C; Operating Temperature Min: -40°C; Packaging: Ammo Pack; Height: 11.5mm; Diameter: 8mm; Capacitance: 470uF; Rated Voltage (DC): 16V
footprint WCAP-ATG8_D8H11.5
pins: 1 P, 2 N

## 860010374014
designator C?, comment 680uF  (value not drawn)
WCAP-ATG8 Aluminum Electrolytic Capacitor, Radial THT, D8xH16mm, 680uF, 16V; Manufacturer: Wurth Elektronik; Manufacturer Part Number: 860010374014; Capacitance Tolerance: +/-20%; Dissipation Factor: 16%; Endurance: 2000h; Leakage Current: 108.8uA; Ripple Current: 640mA; Technical Reference: ATBE160681M016DSPA7B000; ComponentLink1Description: Manufacturer Link; ComponentLink1URL: https://www.we-online.com/redexpert/article/860010374014?ad; ComponentLink2Description: Datasheet; ComponentLink2URL: https://www.we-online.com/redexpert/spec/860010374014?ad; Category: Aluminum Electrolytic Capacitors; Match Code: WCAP-ATG8; Mount: Through Hole; Operating Temperature Max: 85°C; Operating Temperature Min: -40°C; Packaging: Ammo Pack; Height: 16mm; Diameter: 8mm; Capacitance: 680uF; Rated Voltage (DC): 16V
footprint WCAP-ATG8_D8H16
pins: 1 P, 2 N

## 860010375013
designator C?, comment 560uF  (value not drawn)
WCAP-ATG8 Aluminum Electrolytic Capacitor, Radial THT, D10xH12.5mm, 560uF, 16V; Manufacturer: Wurth Elektronik; Manufacturer Part Number: 860010375013; Capacitance Tolerance: +/-20%; Dissipation Factor: 16%; Endurance: 2000h; Leakage Current: 89.6uA; Ripple Current: 572mA; Technical Reference: ATBF125561M016DSPA9B000; ComponentLink1Description: Manufacturer Link; ComponentLink1URL: https://www.we-online.com/redexpert/article/860010375013?ad; ComponentLink2Description: Datasheet; ComponentLink2URL: https://www.we-online.com/redexpert/spec/860010375013?ad; Category: Aluminum Electrolytic Capacitors; Match Code: WCAP-ATG8; Mount: Through Hole; Operating Temperature Max: 85°C; Operating Temperature Min: -40°C; Packaging: Ammo Pack; Height: 12.5mm; Diameter: 10mm; Capacitance: 560uF; Rated Voltage (DC): 16V
footprint WCAP-ATG8_D10H12.5
pins: 1 P, 2 N

## 860010375015
designator C?, comment 680uF  (value not drawn)
WCAP-ATG8 Aluminum Electrolytic Capacitor, Radial THT, D10xH12.5mm, 680uF, 16V; Manufacturer: Wurth Elektronik; Manufacturer Part Number: 860010375015; Capacitance Tolerance: +/-20%; Dissipation Factor: 16%; Endurance: 2000h; Leakage Current: 108.8uA; Ripple Current: 682mA; Technical Reference: ATBF125681M016DSPA9B000; ComponentLink1Description: Manufacturer Link; ComponentLink1URL: https://www.we-online.com/redexpert/article/860010375015?ad; ComponentLink2Description: Datasheet; ComponentLink2URL: https://www.we-online.com/redexpert/spec/860010375015?ad; Category: Aluminum Electrolytic Capacitors; Match Code: WCAP-ATG8; Mount: Through Hole; Operating Temperature Max: 85°C; Operating Temperature Min: -40°C; Packaging: Ammo Pack; Height: 12.5mm; Diameter: 10mm; Capacitance: 680uF; Rated Voltage (DC): 16V
footprint WCAP-ATG8_D10H12.5
pins: 1 P, 2 N

## 860010375016
designator C?, comment 820uF  (value not drawn)
WCAP-ATG8 Aluminum Electrolytic Capacitor, Radial THT, D10xH16mm, 820uF, 16V; Manufacturer: Wurth Elektronik; Manufacturer Part Number: 860010375016; Capacitance Tolerance: +/-20%; Dissipation Factor: 16%; Endurance: 2000h; Leakage Current: 131.2uA; Ripple Current: 803mA; Technical Reference: ATBF160821M016DSPAAB000; ComponentLink1Description: Manufacturer Link; ComponentLink1URL: https://www.we-online.com/redexpert/article/860010375016?ad; ComponentLink2Description: Datasheet; ComponentLink2URL: https://www.we-online.com/redexpert/spec/860010375016?ad; Category: Aluminum Electrolytic Capacitors; Match Code: WCAP-ATG8; Mount: Through Hole; Operating Temperature Max: 85°C; Operating Temperature Min: -40°C; Packaging: Ammo Pack; Height: 16mm; Diameter: 10mm; Capacitance: 820uF; Rated Voltage (DC): 16V
footprint WCAP-ATG8_D10H16
pins: 1 P, 2 N

## 860010375017
designator C?, comment 1000uF  (value not drawn)
WCAP-ATG8 Aluminum Electrolytic Capacitor, Radial THT, D10xH16mm, 1000uF, 16V; Manufacturer: Wurth Elektronik; Manufacturer Part Number: 860010375017; Capacitance Tolerance: +/-20%; Dissipation Factor: 16%; Endurance: 2000h; Leakage Current: 160uA; Ripple Current: 869mA; Technical Reference: ATBF160102M016DSPAAB000; ComponentLink1Description: Manufacturer Link; ComponentLink1URL: https://www.we-online.com/redexpert/article/860010375017?ad; ComponentLink2Description: Datasheet; ComponentLink2URL: https://www.we-online.com/redexpert/spec/860010375017?ad; Category: Aluminum Electrolytic Capacitors; Match Code: WCAP-ATG8; Mount: Through Hole; Operating Temperature Max: 85°C; Operating Temperature Min: -40°C; Packaging: Ammo Pack; Height: 16mm; Diameter: 10mm; Capacitance: 1000uF; Rated Voltage (DC): 16V
footprint WCAP-ATG8_D10H16
pins: 1 P, 2 N

## 860010375018
designator C?, comment 1200uF  (value not drawn)
WCAP-ATG8 Aluminum Electrolytic Capacitor, Radial THT, D10xH16mm, 1200uF, 16V; Manufacturer: Wurth Elektronik; Manufacturer Part Number: 860010375018; Capacitance Tolerance: +/-20%; Dissipation Factor: 16%; Endurance: 2000h; Leakage Current: 192uA; Ripple Current: 979mA; Technical Reference: ATBF160122M016DSPAAB000; ComponentLink1Description: Manufacturer Link; ComponentLink1URL: https://www.we-online.com/redexpert/article/860010375018?ad; ComponentLink2Description: Datasheet; ComponentLink2URL: https://www.we-online.com/redexpert/spec/860010375018?ad; Category: Aluminum Electrolytic Capacitors; Match Code: WCAP-ATG8; Mount: Through Hole; Operating Temperature Max: 85°C; Operating Temperature Min: -40°C; Packaging: Ammo Pack; Height: 16mm; Diameter: 10mm; Capacitance: 1200uF; Rated Voltage (DC): 16V
footprint WCAP-ATG8_D10H16
pins: 1 P, 2 N

## 860010375019
designator C?, comment 1500uF  (value not drawn)
WCAP-ATG8 Aluminum Electrolytic Capacitor, Radial THT, D10xH20mm, 1500uF, 16V; Manufacturer: Wurth Elektronik; Manufacturer Part Number: 860010375019; Capacitance Tolerance: +/-20%; Dissipation Factor: 16%; Endurance: 2000h; Leakage Current: 240uA; Ripple Current: 1100mA; Technical Reference: ATBF200152M016DSPAAB000; ComponentLink1Description: Manufacturer Link; ComponentLink1URL: https://www.we-online.com/redexpert/article/860010375019?ad; ComponentLink2Description: Datasheet; ComponentLink2URL: https://www.we-online.com/redexpert/spec/860010375019?ad; Category: Aluminum Electrolytic Capacitors; Match Code: WCAP-ATG8; Mount: Through Hole; Operating Temperature Max: 85°C; Operating Temperature Min: -40°C; Packaging: Ammo Pack; Height: 20mm; Diameter: 10mm; Capacitance: 1500uF; Rated Voltage (DC): 16V
footprint WCAP-ATG8_D10H20
pins: 1 P, 2 N

## 860010378020
designator C?, comment 1800uF  (value not drawn)
WCAP-ATG8 Aluminum Electrolytic Capacitor, Radial THT, D13xH20mm, 1800uF, 16V; Manufacturer: Wurth Elektronik; Manufacturer Part Number: 860010378020; Capacitance Tolerance: +/-20%; Dissipation Factor: 16%; Endurance: 2000h; Leakage Current: 288uA; Ripple Current: 1298mA; Technical Reference: ATBI200182M016DSPACB000; ComponentLink1Description: Manufacturer Link; ComponentLink1URL: https://www.we-online.com/redexpert/article/860010378020?ad; ComponentLink2Description: Datasheet; ComponentLink2URL: https://www.we-online.com/redexpert/spec/860010378020?ad; Category: Aluminum Electrolytic Capacitors; Match Code: WCAP-ATG8; Mount: Through Hole; Operating Temperature Max: 85°C; Operating Temperature Min: -40°C; Packaging: Ammo Pack; Height: 20mm; Diameter: 13mm; Capacitance: 1800uF; Rated Voltage (DC): 16V
footprint WCAP-ATG8_D13H20
pins: 1 P, 2 N

## 860010378021
designator C?, comment 2200uF  (value not drawn)
WCAP-ATG8 Aluminum Electrolytic Capacitor, Radial THT, D13xH20mm, 2200uF, 16V; Manufacturer: Wurth Elektronik; Manufacturer Part Number: 860010378021; Capacitance Tolerance: +/-20%; Dissipation Factor: 16%; Endurance: 2000h; Leakage Current: 352uA; Ripple Current: 1485mA; Technical Reference: ATBI200222M016DSPACB000; ComponentLink1Description: Manufacturer Link; ComponentLink1URL: https://www.we-online.com/redexpert/article/860010378021?ad; ComponentLink2Description: Datasheet; ComponentLink2URL: https://www.we-online.com/redexpert/spec/860010378021?ad; Category: Aluminum Electrolytic Capacitors; Match Code: WCAP-ATG8; Mount: Through Hole; Operating Temperature Max: 85°C; Operating Temperature Min: -40°C; Packaging: Ammo Pack; Height: 20mm; Diameter: 13mm; Capacitance: 2200uF; Rated Voltage (DC): 16V
footprint WCAP-ATG8_D13H20
pins: 1 P, 2 N

## 860010378022
designator C?, comment 2700uF  (value not drawn)
WCAP-ATG8 Aluminum Electrolytic Capacitor, Radial THT, D13xH20mm, 2700uF, 16V; Manufacturer: Wurth Elektronik; Manufacturer Part Number: 860010378022; Capacitance Tolerance: +/-20%; Dissipation Factor: 16%; Endurance: 2000h; Leakage Current: 432uA; Ripple Current: 1716mA; Technical Reference: ATBI200272M016DSPACB000; ComponentLink1Description: Manufacturer Link; ComponentLink1URL: https://www.we-online.com/redexpert/article/860010378022?ad; ComponentLink2Description: Datasheet; ComponentLink2URL: https://www.we-online.com/redexpert/spec/860010378022?ad; Category: Aluminum Electrolytic Capacitors; Match Code: WCAP-ATG8; Mount: Through Hole; Operating Temperature Max: 85°C; Operating Temperature Min: -40°C; Packaging: Ammo Pack; Height: 20mm; Diameter: 13mm; Capacitance: 2700uF; Rated Voltage (DC): 16V
footprint WCAP-ATG8_D13H20
pins: 1 P, 2 N

## 860010378023
designator C?, comment 3300uF  (value not drawn)
WCAP-ATG8 Aluminum Electrolytic Capacitor, Radial THT, D13xH20mm, 3300uF, 16V; Manufacturer: Wurth Elektronik; Manufacturer Part Number: 860010378023; Capacitance Tolerance: +/-20%; Dissipation Factor: 16%; Endurance: 2000h; Leakage Current: 528uA; Ripple Current: 1750mA; Technical Reference: ATBI200332M016DSPACB000; ComponentLink1Description: Manufacturer Link; ComponentLink1URL: https://www.we-online.com/redexpert/article/860010378023?ad; ComponentLink2Description: Datasheet; ComponentLink2URL: https://www.we-online.com/redexpert/spec/860010378023?ad; Category: Aluminum Electrolytic Capacitors; Match Code: WCAP-ATG8; Mount: Through Hole; Operating Temperature Max: 85°C; Operating Temperature Min: -40°C; Packaging: Ammo Pack; Height: 20mm; Diameter: 13mm; Capacitance: 3300uF; Rated Voltage (DC): 16V
footprint WCAP-ATG8_D13H20
pins: 1 P, 2 N

## 860010380024
designator C?, comment 3900uF  (value not drawn)
WCAP-ATG8 Aluminum Electrolytic Capacitor, Radial THT, D16xH25mm, 3900uF, 16V; Manufacturer: Wurth Elektronik; Manufacturer Part Number: 860010380024; Capacitance Tolerance: +/-20%; Dissipation Factor: 16%; Endurance: 2000h; Leakage Current: 624uA; Ripple Current: 2002mA; Technical Reference: ATBK250392M016DSPAEB000; ComponentLink1Description: Manufacturer Link; ComponentLink1URL: https://www.we-online.com/redexpert/article/860010380024?ad; ComponentLink2Description: Datasheet; ComponentLink2URL: https://www.we-online.com/redexpert/spec/860010380024?ad; Category: Aluminum Electrolytic Capacitors; Match Code: WCAP-ATG8; Mount: Through Hole; Operating Temperature Max: 85°C; Operating Temperature Min: -40°C; Packaging: Ammo Pack; Height: 25mm; Diameter: 16mm; Capacitance: 3900uF; Rated Voltage (DC): 16V
footprint WCAP-ATG8_D16H25
pins: 1 P, 2 N
